# Altium footprint library Molex FFC - FPC Connectors (Through-Hole).PcbLib: 219 footprints (part 11 of 14)
Each footprint in its own frame and in the unit in brackets; x right, y up, seen from the top. Pads: shape width x height; smd on the part's side, far side on the other; paste and mask are expansions set on the pad; w line width, h text height; cw(c..) or ccw(c..) is an arc to the next point about the centre after c.
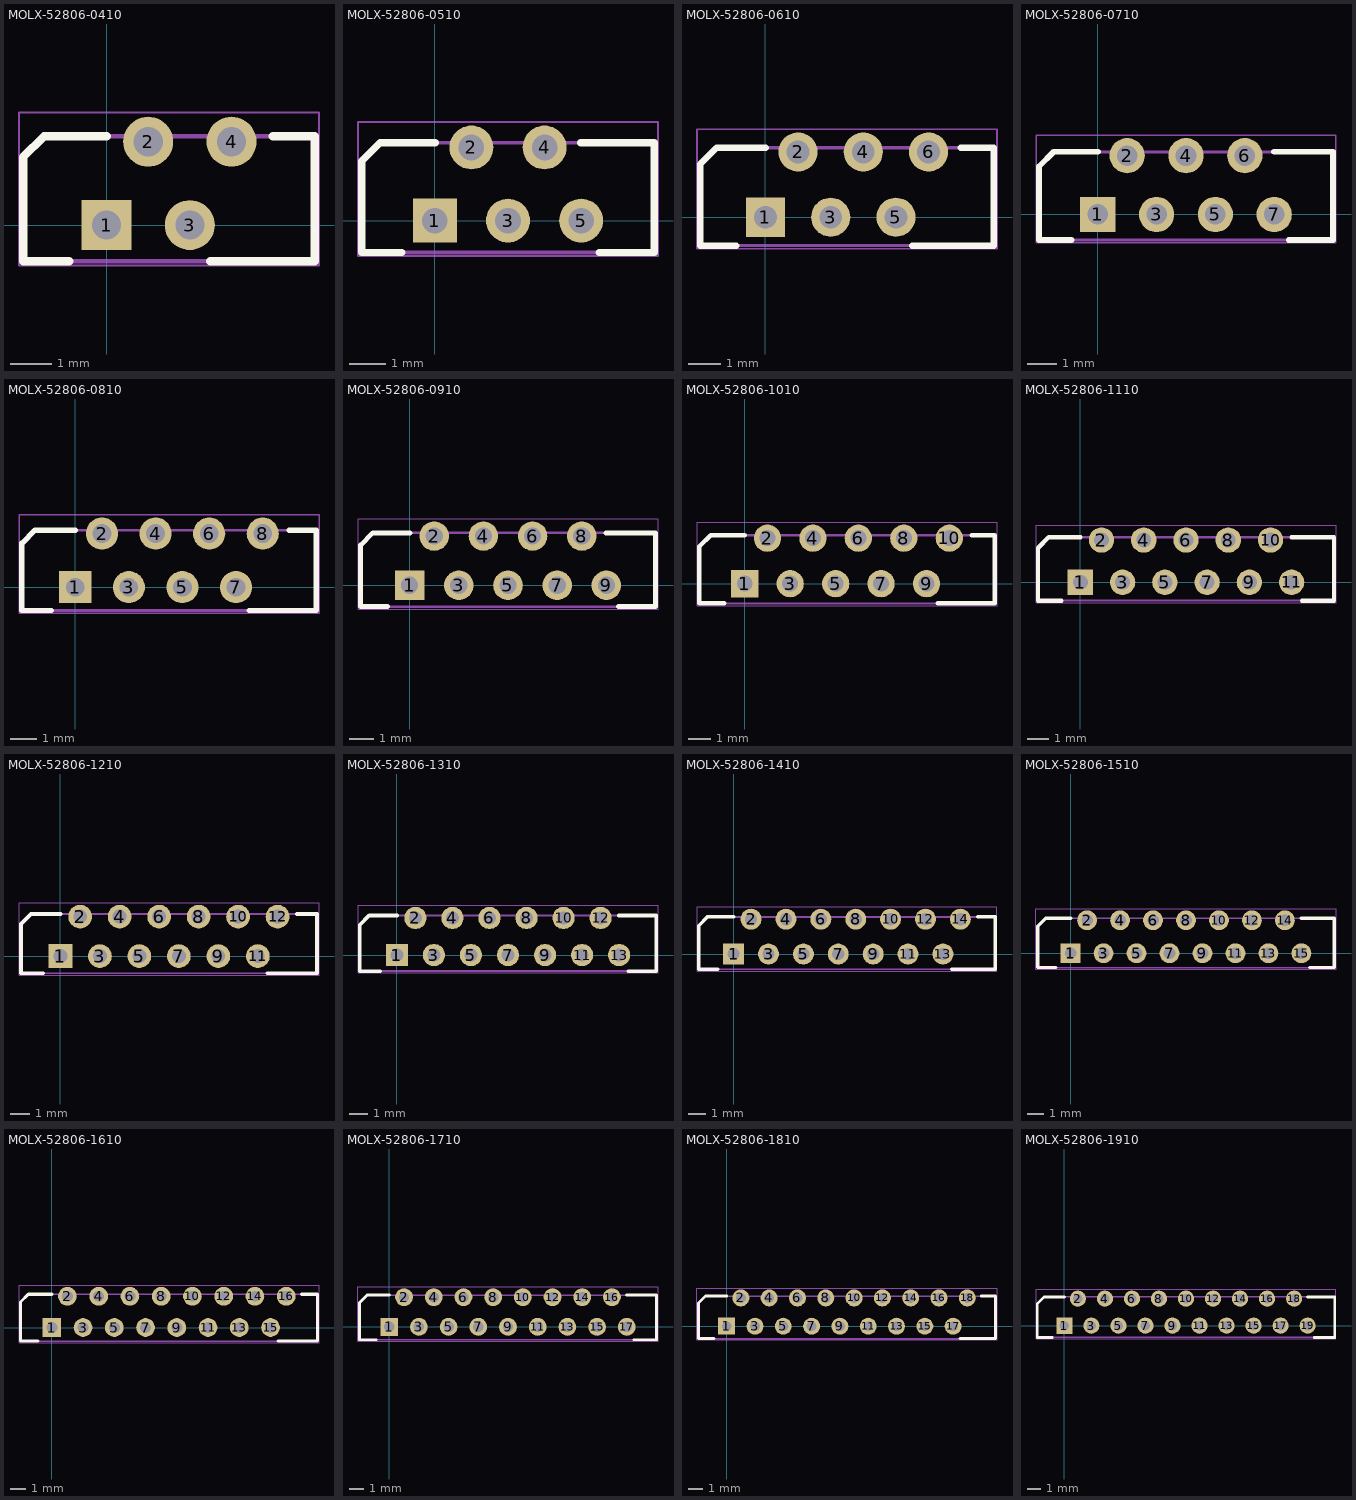
[diagram p10: the footprints below, top view; thin cyan lines are the x and y axes]

## MOLX-52806-0410 [mm] "FFC Connector, 4-Leads, Vertical, Pitch 1.0 mm, Mated Height 5.4 mm, Through Hole"
height 5.412
pads (4):
  rect 1.2x1.2 hole 0.7: 1(0,0)
  round 1.2 hole 0.7: 2(1,2) 3(2,0) 4(3,2)
Top Overlay:
  lines w0.2: -0.896,-0.87 -2,-0.87 -2,1.63 -1.5,2.13 0.008,2.13 ; 2.494,-0.87 5,-0.87 5,2.13 3.992,2.13
Mechanical 13:
  lines w0.1: -2,-0.87 5,-0.87 5,2.13 -1.5,2.13 -2,1.63 -2,-0.87
Mechanical 15:
  lines w0.05: -2.1,-0.97 -2.1,2.7 5.1,2.7 5.1,-0.97 -2.1,-0.97
3D body "52806-0410.stp": height 5.41, standoff -3.19, extent -2,-0.87 5,2.13

## MOLX-52806-0510 [mm] "FFC Connector, 5-Leads, Vertical, Pitch 1.0 mm, Mated Height 5.4 mm, Through Hole"
height 5.412
pads (5):
  rect 1.2x1.2 hole 0.7: 1(0,0)
  round 1.2 hole 0.7: 2(1,2) 3(2,0) 4(3,2) 5(4,0)
Top Overlay:
  lines w0.2: -0.896,-0.87 -2,-0.87 -2,1.63 -1.5,2.13 0.008,2.13 ; 3.992,2.13 6,2.13 6,-0.87 4.494,-0.87
Mechanical 13:
  lines w0.1: -2,-0.87 -2,1.63 -1.5,2.13 6,2.13 6,-0.87 -2,-0.87
Mechanical 15:
  lines w0.05: -2.1,-0.97 6.1,-0.97 6.1,2.7 -2.1,2.7 -2.1,-0.97
3D body "52806-0510.stp": height 5.41, standoff -3.19, extent -2,-0.87 6,2.13

## MOLX-52806-0610 [mm] "FFC Connector, 6-Leads, Vertical, Pitch 1.0 mm, Mated Height 5.4 mm, Through Hole"
height 5.412
pads (6):
  rect 1.2x1.2 hole 0.7: 1(0,0)
  round 1.2 hole 0.7: 2(1,2) 3(2,0) 4(3,2) 5(4,0) 6(5,2)
Top Overlay:
  lines w0.2: -0.896,-0.87 -2,-0.87 -2,1.63 -1.5,2.13 0.008,2.13 ; 4.494,-0.87 7,-0.87 7,2.13 5.992,2.13
Mechanical 13:
  lines w0.1: -2,-0.87 7,-0.87 7,2.13 -1.5,2.13 -2,1.63 -2,-0.87
Mechanical 15:
  lines w0.05: -2.1,-0.97 -2.1,2.7 7.1,2.7 7.1,-0.97 -2.1,-0.97
3D body "52806-0610.stp": height 5.41, standoff -3.19, extent -2,-0.87 7,2.13

## MOLX-52806-0710 [mm] "FFC Connector, 7-Leads, Vertical, Pitch 1.0 mm, Mated Height 5.4 mm, Through Hole"
height 5.412
pads (7):
  rect 1.2x1.2 hole 0.7: 1(0,0)
  round 1.2 hole 0.7: 2(1,2) 3(2,0) 4(3,2) 5(4,0) 6(5,2) 7(6,0)
Top Overlay:
  lines w0.2: -0.896,-0.87 -2,-0.87 -2,1.63 -1.5,2.13 0.008,2.13 ; 5.992,2.13 8,2.13 8,-0.87 6.494,-0.87
Mechanical 13:
  lines w0.1: -2,-0.87 -2,1.63 -1.5,2.13 8,2.13 8,-0.87 -2,-0.87
Mechanical 15:
  lines w0.05: -2.1,-0.97 8.1,-0.97 8.1,2.7 -2.1,2.7 -2.1,-0.97
3D body "52806-0710.stp": height 5.41, standoff -3.19, extent -2,-0.87 8,2.13

## MOLX-52806-0810 [mm] "FFC Connector, 8-Leads, Vertical, Pitch 1.0 mm, Mated Height 5.4 mm, Through Hole"
height 5.412
pads (8):
  rect 1.2x1.2 hole 0.7: 1(0,0)
  round 1.2 hole 0.7: 2(1,2) 3(2,0) 4(3,2) 5(4,0) 6(5,2) 7(6,0) 8(7,2)
Top Overlay:
  lines w0.2: -2,1.63 -2,-0.87 -0.895,-0.87 ; -1.995,1.635 -1.5,2.13 0.008,2.13 ; 6.494,-0.87 9,-0.87 9,2.13 7.992,2.13
Mechanical 13:
  lines w0.1: -2,-0.87 -2,1.63 -1.5,2.13 9,2.13 9,-0.87 -2,-0.87
Mechanical 15:
  lines w0.05: -2.1,-0.97 9.1,-0.97 9.1,2.7 -2.1,2.7 -2.1,-0.97
3D body "52806-0810.stp": height 5.41, standoff -3.19, extent -2,-0.87 9,2.13

## MOLX-52806-0910 [mm] "FFC Connector, 9-Leads, Vertical, Pitch 1.0 mm, Mated Height 5.4 mm, Through Hole"
height 5.412
pads (9):
  rect 1.2x1.2 hole 0.7: 1(0,0)
  round 1.2 hole 0.7: 2(1,2) 3(2,0) 4(3,2) 5(4,0) 6(5,2) 7(6,0) 8(7,2) 9(8,0)
Top Overlay:
  lines w0.2: -2,1.63 -2,-0.87 -0.895,-0.87 ; -1.995,1.635 -1.5,2.13 0.008,2.13 ; 7.992,2.13 10,2.13 10,-0.87 8.494,-0.87
Mechanical 13:
  lines w0.1: -2,-0.87 10,-0.87 10,2.13 -1.5,2.13 -2,1.63 -2,-0.87
Mechanical 15:
  lines w0.05: -2.1,-0.97 -2.1,2.7 10.1,2.7 10.1,-0.97 -2.1,-0.97
3D body "52806-0910.stp": height 5.41, standoff -3.19, extent -2,-0.87 10,2.13

## MOLX-52806-1010 [mm] "FFC Connector, 10-Leads, Vertical, Pitch 1.0 mm, Mated Height 5.4 mm, Through Hole"
height 5.412
pads (10):
  rect 1.2x1.2 hole 0.7: 1(0,0)
  round 1.2 hole 0.7: 2(1,2) 3(2,0) 4(3,2) 5(4,0) 6(5,2) 7(6,0) 8(7,2) 9(8,0) 10(9,2)
Top Overlay:
  lines w0.2: -2,1.63 -2,-0.87 -0.895,-0.87 ; -1.995,1.635 -1.5,2.13 0.008,2.13 ; 8.494,-0.87 11,-0.87 11,2.13 9.992,2.13
Mechanical 13:
  lines w0.1: -2,-0.87 11,-0.87 11,2.13 -1.5,2.13 -2,1.63 -2,-0.87
Mechanical 15:
  lines w0.05: -2.1,-0.97 -2.1,2.7 11.1,2.7 11.1,-0.97 -2.1,-0.97
3D body "52806-1010.stp": height 5.41, standoff -3.19, extent -2,-0.87 11,2.13

## MOLX-52806-1110 [mm] "FFC Connector, 11-Leads, Vertical, Pitch 1.0 mm, Mated Height 5.4 mm, Through Hole"
height 5.412
pads (11):
  rect 1.2x1.2 hole 0.7: 1(0,0)
  round 1.2 hole 0.7: 2(1,2) 3(2,0) 4(3,2) 5(4,0) 6(5,2) 7(6,0) 8(7,2) 9(8,0) 10(9,2) 11(10,0)
Top Overlay:
  lines w0.2: -2,1.63 -2,-0.87 -0.895,-0.87 ; -1.995,1.635 -1.5,2.13 0.008,2.13 ; 9.992,2.13 12,2.13 12,-0.87 10.494,-0.87
Mechanical 13:
  lines w0.1: -2,-0.87 -2,1.63 -1.5,2.13 12,2.13 12,-0.87 -2,-0.87
Mechanical 15:
  lines w0.05: -2.1,-0.97 12.1,-0.97 12.1,2.7 -2.1,2.7 -2.1,-0.97
3D body "52806-1110.stp": height 5.41, standoff -3.19, extent -2,-0.87 12,2.13

## MOLX-52806-1210 [mm] "FFC Connector, 12-Leads, Vertical, Pitch 1.0 mm, Mated Height 5.4 mm, Through Hole"
height 5.412
pads (12):
  rect 1.2x1.2 hole 0.7: 1(0,0)
  round 1.2 hole 0.7: 2(1,2) 3(2,0) 4(3,2) 5(4,0) 6(5,2) 7(6,0) 8(7,2) 9(8,0) 10(9,2) 11(10,0) 12(11,2)
Top Overlay:
  lines w0.2: -2,1.63 -2,-0.87 -0.895,-0.87 ; -1.995,1.635 -1.5,2.13 0.008,2.13 ; 10.493,-0.87 13,-0.87 13,2.13 11.992,2.13
Mechanical 13:
  lines w0.1: -2,-0.87 -2,1.63 -1.5,2.13 13,2.13 13,-0.87 -2,-0.87
Mechanical 15:
  lines w0.05: -2.1,-0.97 13.1,-0.97 13.1,2.7 -2.1,2.7 -2.1,-0.97
3D body "52806-1210.stp": height 5.41, standoff -3.19, extent -2,-0.87 13,2.13

## MOLX-52806-1310 [mm] "FFC Connector, 13-Leads, Vertical, Pitch 1.0 mm, Mated Height 5.4 mm, Through Hole"
height 5.412
pads (13):
  rect 1.2x1.2 hole 0.7: 1(0,0)
  round 1.2 hole 0.7: 2(1,2) 3(2,0) 4(3,2) 5(4,0) 6(5,2) 7(6,0) 8(7,2) 9(8,0) 10(9,2) 11(10,0) 12(11,2) 13(12,0)
Top Overlay:
  lines w0.2: -2,1.63 -2,-0.87 -0.895,-0.87 ; -1.995,1.635 -1.5,2.13 0.008,2.13 ; 11.992,2.13 14,2.13 14,-0.87 12.493,-0.87
Mechanical 13:
  lines w0.1: -2,-0.87 14,-0.87 14,2.13 -1.5,2.13 -2,1.63 -2,-0.87
Mechanical 15:
  lines w0.05: -2.1,-0.97 -2.1,2.7 14.1,2.7 14.1,-0.97 -2.1,-0.97
3D body "52806-1310.stp": height 5.41, standoff -3.19, extent -2,-0.87 14,2.13

## MOLX-52806-1410 [mm] "FFC Connector, 14-Leads, Vertical, Pitch 1.0 mm, Mated Height 5.4 mm, Through Hole"
height 5.412
pads (14):
  rect 1.2x1.2 hole 0.7: 1(0,0)
  round 1.2 hole 0.7: 2(1,2) 3(2,0) 4(3,2) 5(4,0) 6(5,2) 7(6,0) 8(7,2) 9(8,0) 10(9,2) 11(10,0) 12(11,2) 13(12,0) 14(13,2)
Top Overlay:
  lines w0.2: -0.896,-0.87 -2,-0.87 -2,1.63 -1.5,2.13 0.008,2.13 ; 12.494,-0.87 15,-0.87 15,2.13 13.992,2.13
Mechanical 13:
  lines w0.1: -2,-0.87 15,-0.87 15,2.13 -1.5,2.13 -2,1.63 -2,-0.87
Mechanical 15:
  lines w0.05: -2.1,-0.97 -2.1,2.7 15.1,2.7 15.1,-0.97 -2.1,-0.97
3D body "52806-1410.stp": height 5.41, standoff -3.19, extent -2,-0.87 15,2.13

## MOLX-52806-1510 [mm] "FFC Connector, 15-Leads, Vertical, Pitch 1.0 mm, Mated Height 5.4 mm, Through Hole"
height 5.412
pads (15):
  rect 1.2x1.2 hole 0.7: 1(0,0)
  round 1.2 hole 0.7: 2(1,2) 3(2,0) 4(3,2) 5(4,0) 6(5,2) 7(6,0) 8(7,2) 9(8,0) 10(9,2) 11(10,0) 12(11,2) 13(12,0) 14(13,2) 15(14,0)
Top Overlay:
  lines w0.2: -0.896,-0.87 -2,-0.87 -2,1.63 -1.5,2.13 0.008,2.13 ; 13.992,2.13 16,2.13 16,-0.87 14.494,-0.87
Mechanical 13:
  lines w0.1: -2,-0.87 -2,1.63 -1.5,2.13 16,2.13 16,-0.87 -2,-0.87
Mechanical 15:
  lines w0.05: -2.1,-0.97 16.1,-0.97 16.1,2.7 -2.1,2.7 -2.1,-0.97
3D body "52806-1510.stp": height 5.41, standoff -3.19, extent -2,-0.87 16,2.13

## MOLX-52806-1610 [mm] "FFC Connector, 16-Leads, Vertical, Pitch 1.0 mm, Mated Height 5.4 mm, Through Hole"
height 5.412
pads (16):
  rect 1.2x1.2 hole 0.7: 1(0,0)
  round 1.2 hole 0.7: 2(1,2) 3(2,0) 4(3,2) 5(4,0) 6(5,2) 7(6,0) 8(7,2) 9(8,0) 10(9,2) 11(10,0) 12(11,2) 13(12,0) 14(13,2) 15(14,0) 16(15,2)
Top Overlay:
  lines w0.2: -0.896,-0.87 -2,-0.87 -2,1.63 -1.5,2.13 0.008,2.13 ; 14.494,-0.87 17,-0.87 17,2.13 15.992,2.13
Mechanical 13:
  lines w0.1: -2,-0.87 -2,1.63 -1.5,2.13 17,2.13 17,-0.87 -2,-0.87
Mechanical 15:
  lines w0.05: -2.1,-0.97 17.1,-0.97 17.1,2.7 -2.1,2.7 -2.1,-0.97
3D body "52806-1610.stp": height 5.41, standoff -3.19, extent -2,-0.87 17,2.13

## MOLX-52806-1710 [mm] "FFC Connector, 17-Leads, Vertical, Pitch 1.0 mm, Mated Height 5.4 mm, Through Hole"
height 5.412
pads (17):
  rect 1.2x1.2 hole 0.7: 1(0,0)
  round 1.2 hole 0.7: 2(1,2) 3(2,0) 4(3,2) 5(4,0) 6(5,2) 7(6,0) 8(7,2) 9(8,0) 10(9,2) 11(10,0) 12(11,2) 13(12,0) 14(13,2) 15(14,0) 16(15,2) 17(16,0)
Top Overlay:
  lines w0.2: -0.896,-0.87 -2,-0.87 -2,1.63 -1.5,2.13 0.008,2.13 ; 15.992,2.13 18,2.13 18,-0.87 16.494,-0.87
Mechanical 13:
  lines w0.1: -2,-0.87 18,-0.87 18,2.13 -1.5,2.13 -2,1.63 -2,-0.87
Mechanical 15:
  lines w0.05: -2.1,-0.97 -2.1,2.7 18.1,2.7 18.1,-0.97 -2.1,-0.97
3D body "52806-1710.stp": height 5.41, standoff -3.19, extent -2,-0.87 18,2.13

## MOLX-52806-1810 [mm] "FFC Connector, 18-Leads, Vertical, Pitch 1.0 mm, Mated Height 5.4 mm, Through Hole"
height 5.412
pads (18):
  rect 1.2x1.2 hole 0.7: 1(0,0)
  round 1.2 hole 0.7: 2(1,2) 3(2,0) 4(3,2) 5(4,0) 6(5,2) 7(6,0) 8(7,2) 9(8,0) 10(9,2) 11(10,0) 12(11,2) 13(12,0) 14(13,2) 15(14,0) 16(15,2) 17(16,0) 18(17,2)
Top Overlay:
  lines w0.2: -0.896,-0.87 -2,-0.87 -2,1.63 -1.5,2.13 0.008,2.13 ; 16.494,-0.87 19,-0.87 19,2.13 17.992,2.13
Mechanical 13:
  lines w0.1: -2,-0.87 -2,1.63 -1.5,2.13 19,2.13 19,-0.87 -2,-0.87
Mechanical 15:
  lines w0.05: -2.1,-0.97 19.1,-0.97 19.1,2.7 -2.1,2.7 -2.1,-0.97
3D body "52806-1810.stp": height 5.41, standoff -3.19, extent -2,-0.87 19,2.13

## MOLX-52806-1910 [mm] "FFC Connector, 19-Leads, Vertical, Pitch 1.0 mm, Mated Height 5.4 mm, Through Hole"
height 5.412
pads (19):
  rect 1.2x1.2 hole 0.7: 1(0,0)
  round 1.2 hole 0.7: 2(1,2) 3(2,0) 4(3,2) 5(4,0) 6(5,2) 7(6,0) 8(7,2) 9(8,0) 10(9,2) 11(10,0) 12(11,2) 13(12,0) 14(13,2) 15(14,0) 16(15,2) 17(16,0) 18(17,2) 19(18,0)
Top Overlay:
  lines w0.2: -0.896,-0.87 -2,-0.87 -2,1.63 -1.5,2.13 0.008,2.13 ; 17.992,2.13 20,2.13 20,-0.87 18.494,-0.87
Mechanical 13:
  lines w0.1: -2,-0.87 -2,1.63 -1.5,2.13 20,2.13 20,-0.87 -2,-0.87
Mechanical 15:
  lines w0.05: -2.1,-0.97 20.1,-0.97 20.1,2.7 -2.1,2.7 -2.1,-0.97
3D body "52806-1910.stp": height 5.41, standoff -3.19, extent -2,-0.87 20,2.13